# Altium footprint library kalios.PcbLib: 404 footprints (part 17 of 26)
Each footprint in its own frame and in the unit in brackets; x right, y up, seen from the top. Pads: shape width x height; smd on the part's side, far side on the other; paste and mask are expansions set on the pad; w line width, h text height; cw(c..) or ccw(c..) is an arc to the next point about the centre after c.
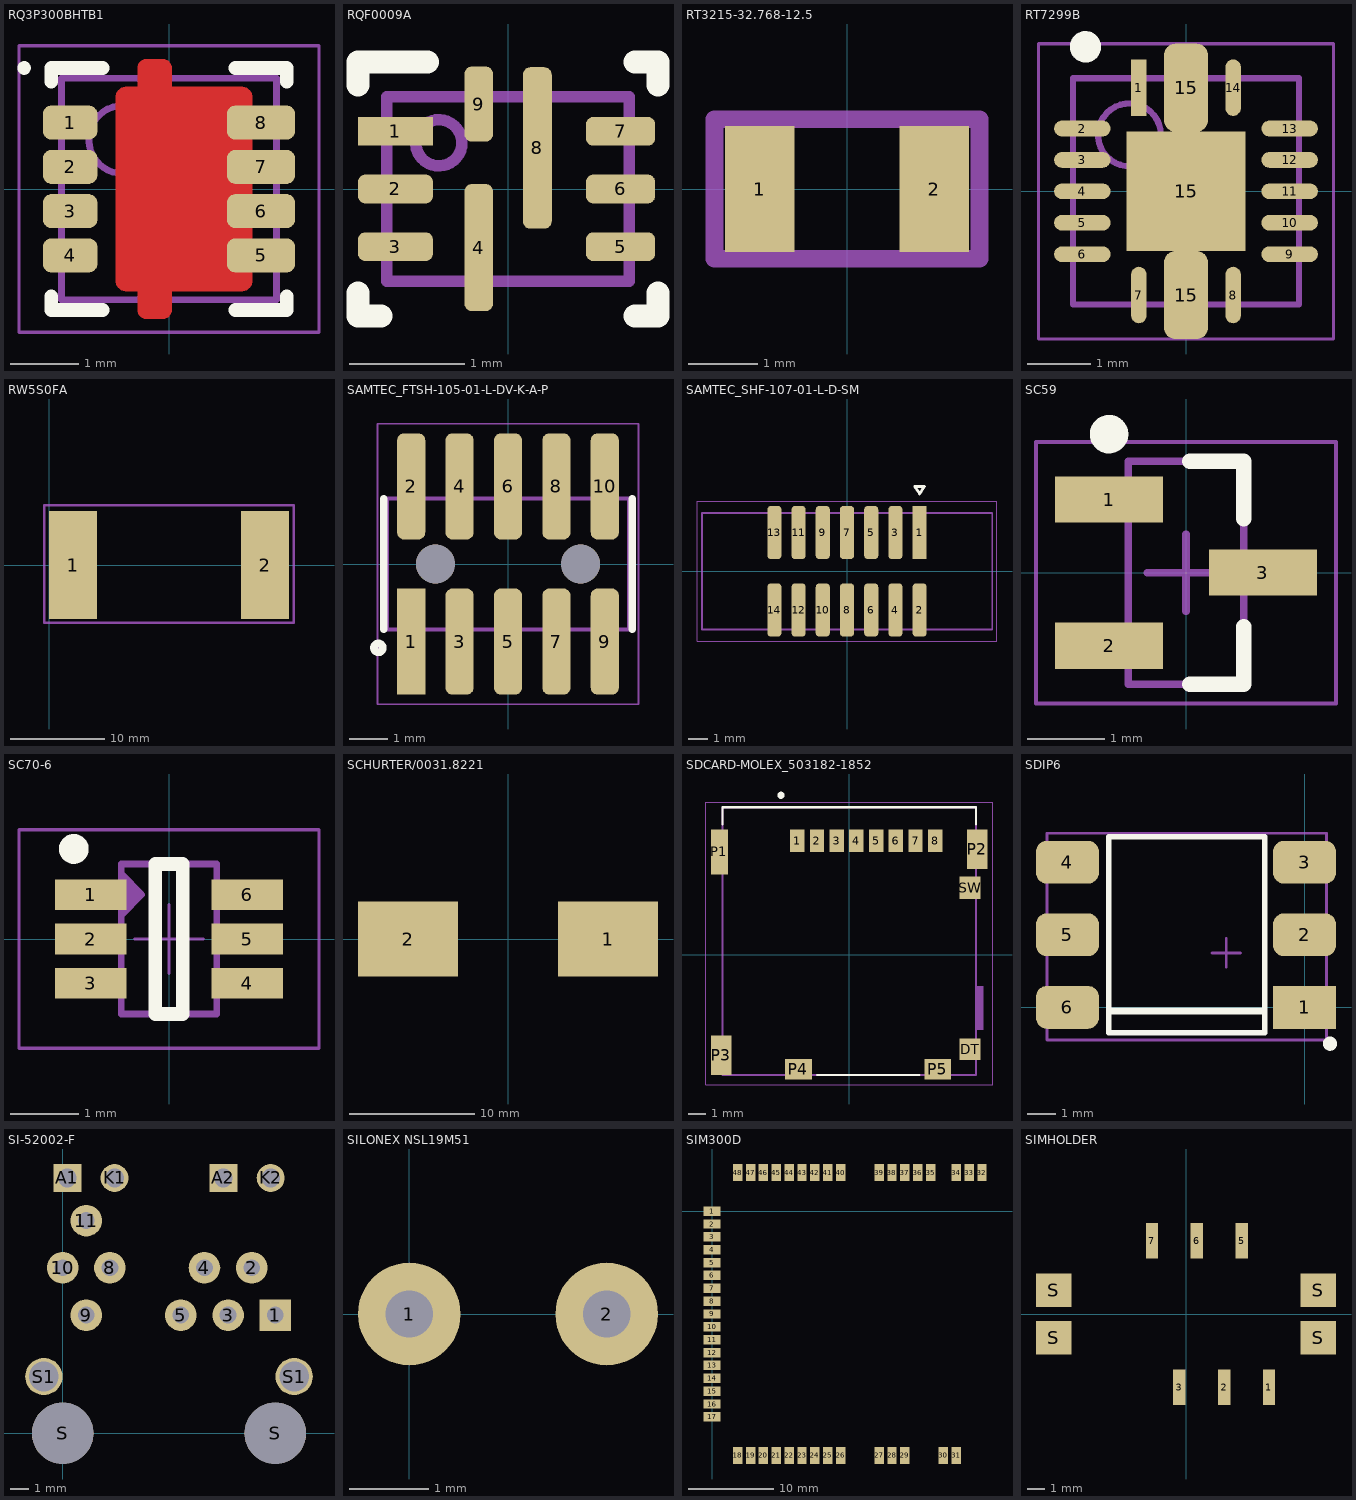
[diagram p16: the footprints below, top view; thin cyan lines are the x and y axes]

## RQ3P300BHTB1 [mm] "8-Leads, Body 3.15x3.05mm, Pitch 0.65mm, Thermal Pad 3.00x2.00mm, Manufacturer Guidelines"
height 0.85
pads (8):
  rrect50% 0.8x0.5 smd: 1(-1.45,0.975) 2(-1.45,0.325) 3(-1.45,-0.325) 4(-1.45,-0.975)
  rrect50% 1x0.5 smd: 5(1.35,-0.975) 6(1.35,-0.325) 7(1.35,0.325) 8(1.35,0.975)
Top Layer:
  region: -0.78,-1.35 -0.78,-1.365 -0.774,-1.394 -0.763,-1.421 -0.747,-1.446 -0.726,-1.467 -0.701,-1.483 -0.674,-1.494 -0.645,-1.5 -0.63,-1.5 -0.46,-1.5 -0.46,-1.775 -0.46,-1.8 -0.441,-1.846 -0.406,-1.881 -0.36,-1.9 -0.335,-1.9 -0.085,-1.9 -0.06,-1.9 -0.014,-1.881 0.021,-1.846 0.04,-1.8 0.04,-1.775 0.04,-1.5 1.07,-1.5 1.085,-1.5 1.114,-1.494 1.141,-1.483 1.166,-1.467 1.187,-1.446 1.203,-1.421 1.214,-1.394 1.22,-1.365 1.22,-1.35 1.22,1.35 1.22,1.365 1.214,1.394 1.203,1.421 1.187,1.446 1.166,1.467 1.141,1.483 1.114,1.494 1.085,1.5 1.07,1.5 0.04,1.5 0.04,1.775 0.04,1.8 0.021,1.846 -0.014,1.881 -0.06,1.9 -0.085,1.9 -0.335,1.9 -0.36,1.9 -0.406,1.881 -0.441,1.846 -0.46,1.8 -0.46,1.775 -0.46,1.5 -0.63,1.5 -0.645,1.5 -0.674,1.494 -0.701,1.483 -0.726,1.467 -0.747,1.446 -0.763,1.421 -0.774,1.394 -0.78,1.365 -0.78,1.35
Top Overlay:
  circle w0.1: c-2.125,1.775 r0.05
  lines w0.2: -1.725,-1.575 -1.725,-1.775 -0.97,-1.775 ; -1.725,1.575 -1.725,1.775 -0.97,1.775 ; 0.97,-1.775 1.725,-1.775 1.725,-1.575 ; 0.97,1.775 1.725,1.775 1.725,1.575
Top Assembly:
  circle w0.1: c-0.675,0.725 r0.5
  lines w0.1: -1.575,-1.625 1.575,-1.625 1.575,1.625 -1.575,1.625 -1.575,-1.625
Top Courtyard:
  lines w0.05: -2.2,-2.1 2.2,-2.1 2.2,2.1 -2.2,2.1 -2.2,-2.1
  lines w0.1: -0.5,0 0.5,0 ; 0,-0.5 0,0.5
3D body "RQ3P300BHTB1.STEP": height 0.9, standoff -0.05, extent -1.699,-1.709 1.701,1.711

## RQF0009A [mm]
pads (9):
  rect 0.65x0.25 smd paste+0 mask+0.051: 1(-0.976,0.5)
  rrect50% 0.65x0.25 smd paste+0 mask+0.051: 2(-0.976,0) 3(-0.976,-0.5)
  rrect50% 0.25x1.1 smd paste+0 mask+0.051: 4(-0.254,-0.508)
  rrect50% 0.6x0.25 smd paste+0 mask+0.051: 5(0.976,-0.5) 6(0.976,0) 7(0.976,0.5)
  rrect50% 0.25x1.4 smd paste+0 mask+0.051: 8(0.254,0.356)
  rrect50% 0.25x0.65 smd paste+0 mask+0.051: 9(-0.254,0.737)
Top Overlay:
  lines w0.2: -1.3,-0.9 -1.3,-1.1 -1.1,-1.1 ; -1.3,0.9 -1.3,1.1 -0.7,1.1 ; 1.1,-1.1 1.3,-1.1 1.3,-0.9 ; 1.1,1.1 1.3,1.1 1.3,0.9
Top 3D Body:
  circle w0.1: c-0.6,0.4 r0.2
  lines w0.1: -1.05,-0.8 1.05,-0.8 1.05,0.8 -1.05,0.8 -1.05,-0.8
Top Designator:
  text ".Designator" at -7.618,-0.508 h1.52
3D body "TPS56623x.STEP": height 1.04, standoff -0.01, extent -1.06,-0.813 1.06,0.807

## RT3215-32.768-12.5 [mm]
pads (2):
  rect 1x1.8 smd: 1(-1.25,0) 2(1.25,0)
Top Courtyard:
  lines w0.254: -1.9,-1 -1.9,1 1.9,1 1.9,-1 -1.9,-1
Top Designator:
  text ".Designator" at -3.499,-0.233 h0.7
3D body "RT3215-32.768-12.5-TR.STEP": height 0.9, standoff 0, extent -1.61,-0.76 1.61,0.76

## RT7299B [mm]
height 0.8
pads (17):
  rect 0.25x0.9 smd: 1(-0.75,1.65)
  oval 0.9x0.25 smd: 2(-1.65,1) 3(-1.65,0.5) 4(-1.65,0) 5(-1.65,-0.5) 6(-1.65,-1) 9(1.65,-1) 10(1.65,-0.5) 11(1.65,0) 12(1.65,0.5) 13(1.65,1)
  oval 0.25x0.9 smd: 7(-0.75,-1.65) 8(0.75,-1.65) 14(0.75,1.65)
  rrect50% 0.7x1.4 smd: 15(0,-1.65) 15(0,1.65)
  rect 1.9x1.9 smd: 15(0,0)
Top Overlay:
  circle w0.25: c-1.6,2.3 r0.125
Top 3D Body:
  circle w0.1: c-0.9,0.9 r0.5
  lines w0.1: -1.8,-1.8 1.8,-1.8 1.8,1.8 -1.8,1.8 -1.8,-1.8
Top Courtyard:
  lines w0.05: -2.35,-2.35 2.35,-2.35 2.35,2.35 -2.35,2.35 -2.35,-2.35
  lines w0.1: -0.5,0 0.5,0 ; 0,-0.5 0,0.5
Top Designator:
  text ".Designator" at -7.618,-0.42 h1.52
3D body "WQFN3.5x3.5.STEP": height 0.82, standoff 0.01, extent -1.75,-1.75 1.75,1.75

## RW5S0FA [mm]
pads (2):
  rect 5.08x11.43 smd: 1(2.54,0) 2(22.86,0)
Top Courtyard:
  lines w0.254: -0.508,-6.096 25.908,-6.096 25.908,6.35 -0.508,6.35 -0.508,-6.096
3D body "RW5S0FA10K0JE--3DModel-STEP-56544.STEP": height 10.31, standoff 0, extent 2.464,-4.572 22.936,4.699

## SAMTEC_FTSH-105-01-L-DV-K-A-P [mm]
pads (12):
  rect 0.74x2.79 smd: 1(-2.54,-2.035)
  rrect50% 0.74x2.79 smd: 2(-2.54,2.035) 3(-1.27,-2.035) 4(-1.27,2.035) 5(0,-2.035) 6(0,2.035) 7(1.27,-2.035) 8(1.27,2.035) 9(2.54,-2.035) 10(2.54,2.035)
  round 1.02 hole 1.02 unplated mask+0.102: ""(-1.905,0) ""(1.905,0)
Top Overlay:
  circle w0.2: c-3.4,-2.2 r0.115
  lines w0.2: -3.26,-1.715 -3.26,1.715 ; 3.26,-1.715 3.26,1.715
Top 3D Body:
  circle w0.2: c-3.4,-2.2 r0.1
  lines w0.1: -3.175,-1.715 -3.175,1.715 3.175,1.715 3.175,-1.715 -3.175,-1.715
Top Courtyard:
  lines w0.05: -3.425,-3.68 -3.425,3.68 3.425,3.68 3.425,-3.68 -3.425,-3.68
Top Designator:
  text ".Designator" at -3.769,-0.233 h0.7
3D body "FTSH-105-01-L-DV-K-A-P-TR.STEP": height 6.15, standoff -0.83, extent -3.175,-2.921 3.175,2.921

## SAMTEC_SHF-107-01-L-D-SM [mm]
pads (14):
  rect 0.74x2.795 smd: 1(3.81,2.032)
  rrect50% 0.74x2.795 smd: 2(3.81,-2.032) 3(2.54,2.032) 4(2.54,-2.032) 5(1.27,2.032) 6(1.27,-2.032) 7(0,2.033) 8(0,-2.033) 9(-1.27,2.032) 10(-1.27,-2.032) 11(-2.54,2.032) 12(-2.54,-2.032) 13(-3.81,2.032) 14(-3.81,-2.032)
Top Overlay:
  lines w0.152: 3.556,4.445 3.81,4.064 4.064,4.445 3.556,4.445
Top 3D Body:
  lines w0.1: -7.62,-3.048 7.62,-3.048 7.62,3.05 ; -7.604,-3.048 -7.604,3.035 ; 7.62,-2.54 7.62,3.05 ; 7.62,3.05 -7.62,3.05 7.62,3.05
Top Courtyard:
  lines w0.05: -7.87,-3.68 7.87,-3.68 7.87,3.68 -7.87,3.68 -7.87,-3.68
3D body "SHF-107-01-L-D-SM.stp": height 5.33, standoff -0.13, extent -7.62,-3.048 7.62,3.048

## SC59 [mm] "SOT23, 3-Leads, Body 2.90x2.50mm, Pitch 0.95mm, IPC Medium Density"
height 1.1
pads (3):
  rect 1.4x0.6 smd: 1(-1,0.95) 2(-1,-0.95) 3(1,0)
Top Overlay:
  circle w0.25: c-1,1.8 r0.125
  lines w0.2: 0.05,-1.45 0.75,-1.45 0.75,-0.7 ; 0.05,1.45 0.75,1.45 0.75,0.7
Top 3D Body:
  lines w0.1: -0.75,-1.45 0.75,-1.45 0.75,1.45 -0.75,1.45 -0.75,-1.45
Top Courtyard:
  lines w0.05: -1.95,-1.7 1.95,-1.7 1.95,1.7 -1.95,1.7 -1.95,-1.7
  lines w0.1: -0.5,0 0.5,0 ; 0,-0.5 0,0.5
Top Designator:
  text ".Designator" at -7.618,-0.345 h1.52
3D body: height 1.1, standoff 0.05, extent -0.75,-1.45 0.75,1.45

## SC70-6 [mm] "SOT363, 6-Leads, Body 2x1.3mm, Pitch 0.65mm, Lead Span 2.1mm, IPC Low Density"
height 1.1
pads (6):
  rect 1.05x0.45 smd: 1(-1.15,0.65) 2(-1.15,0) 3(-1.15,-0.65) 4(1.15,-0.65) 5(1.15,0) 6(1.15,0.65)
Top Overlay:
  circle w0.254: c-1.397,1.321 r0.092
  lines w0.2: -0.2,-1.1 -0.2,1.1 0.2,1.1 0.2,-1.1 -0.2,-1.1
Top 3D Body:
  lines w0.1: -0.7,0.35 -0.4,0.65 -0.7,0.95 ; -0.7,0.45 -0.5,0.65 -0.7,0.85 ; -0.7,0.55 -0.6,0.65 -0.7,0.75 ; -0.7,-1.1 0.7,-1.1 0.7,1.1 -0.7,1.1 -0.7,-1.1
Top Courtyard:
  lines w0.05: -0.5,0 0,0 ; 0,-0.5 0,0 ; 0,0.5 0,0 ; 0.5,0 0,0 ; -2.2,-1.6 -2.2,1.6 2.2,1.6 2.2,-1.6 -2.2,-1.6
Top Designator:
  text ".Designator" at -7.618,-0.508 h1.52
3D body "SC-70-6.STEP": height 1.1, standoff -0.01, extent -1.15,-1.132 1.1,1.118

## SCHURTER/0031.8221 [mm]
pads (2):
  rect 8x6 smd: 1(8,0) 2(-8,0)
Top Designator:
  text ".Designator" at -7.618,-0.711 h1.52
3D body "0031.8221 with fuse.STEP": height 12.22, standoff 0.22, extent -11.352,-5.003 11.348,4.597

## SDCARD-MOLEX_503182-1852 [mm]
pads (15):
  rect 0.8x1.24 smd: 1(-2.9,6.355) 2(-1.8,6.355) 3(-0.7,6.355) 4(0.4,6.355) 5(1.5,6.355) 6(2.6,6.355) 7(3.7,6.355) 8(4.8,6.355)
  rect 1.16x1.2 smd: DT(6.74,-5.275)
  rect 0.95x2.5 smd: P1(-7.245,5.725)
  rect 1.15x2.2 smd: P2(7.145,5.875) P3(-7.145,-5.605)
  rect 1.5x1.15 smd: P4(-2.84,-6.4) P5(4.94,-6.4)
  rect 1.16x1.25 smd: SW(6.74,3.725)
Top Overlay:
  circle w0.2: c-3.81,8.89 r0.1
  lines w0.127: -7.07,7.28 -7.07,8.225 7.07,8.225 7.07,7.28 ; -1.8,-6.725 3.9,-6.725
Top 3D Body:
  lines w0.127: -7.07,-6.725 7.07,-6.725 7.07,8.225 -7.07,8.225 -7.07,-6.725
Top Courtyard:
  region: 7.47,-4.184 7.085,-4.184 7.085,-1.775 7.47,-1.775
  lines w0.05: -8,-7.25 8,-7.25 8,8.5 -8,8.5 -8,-7.25
Top Designator:
  text ".Designator" at -7.618,0.4 h1.52
3D body "5031821852.STEP": height 1.36, standoff -0.14, extent -7.447,-6.713 7.493,8.237

## SDIP6 [mm] "8-Pin Small Outline Integrated Circuit 1.27 mm Pitch, IPC Low Density"
height 1.75
pads (6):
  rect 2.2x1.5 smd: 1(0,0)
  rrect50% 2.2x1.5 smd: 2(0,2.54) 3(0,5.08) 4(-8.3,5.08) 5(-8.3,2.54) 6(-8.3,0)
Top Overlay:
  circle w0.25: c0.889,-1.27 r0.125
  lines w0.2: -6.858,-0.889 -1.397,-0.889 -1.397,5.969 -6.858,5.969 -6.858,-0.889
  lines w0.254: -6.731,-0.127 -1.53,-0.127
Top Courtyard:
  lines w0.1: -3.243,1.905 -2.243,1.905 ; -2.743,1.405 -2.743,2.405 ; -9.017,-1.143 0.762,-1.143 0.762,6.096 -9.017,6.096 -9.017,-1.143
Top Designator:
  text ".Designator" at -11.768,1.815 h1.52
3D body "User Library-DIP-6-SMD.step": height 3.71, standoff 0, extent -9.038,-1.085 0.762,6.165

## SI-52002-F [mm]
pads (17):
  rect 1.7x1.7 hole 0.9: 1(11.43,6.35)
  round 1.7 hole 0.9: 2(10.16,8.89) 3(8.89,6.35) 4(7.62,8.89) 5(6.35,6.35) 8(2.54,8.89) 9(1.27,6.35) 10(0,8.89) 11(1.27,11.43)
  rect 1.5x1.5 hole 1: A1(0.25,13.72) A2(8.64,13.72)
  round 1.5 hole 1: K1(2.79,13.72) K2(11.18,13.72)
  round 3.3 hole 3.3 unplated: S(0,0) S(11.43,0)
  round 2 hole 1.6: S1(-1.01,3.05) S1(12.44,3.05)
Top Designator:
  text ".Designator" at -1.928,1.372 h1.52
3D body "SI-52003-F.STEP": height 13.97, standoff -3.08, extent -2.375,-10.82 13.755,14.58

## SILONEX NSL19M51 [mm]
pads (2):
  round 1.3 hole 0.6 unplated: 1(0,0) 2(2.5,0)
Top Designator:
  text ".Designator" at -6.407,-0.508 h1.52
3D body "Pièce3.STEP": height 1.7, standoff -5, extent -0.83,-1.7 3.23,1.7

## SIM300D [mm]
pads (48):
  rect 2x1.1 smd: 1(0,0) 2(0,-1.5) 3(0,-3) 4(0,-4.5) 5(0,-6) 6(0,-7.5) 7(0,-9) 8(0,-10.5) 9(0,-12) 10(0,-13.5) 11(0,-15) 12(0,-16.5) 13(0,-18) 14(0,-19.5) 15(0,-21) 16(0,-22.5) 17(0,-24)
  rect 1.1x2 smd: 18(3,-28.5) 19(4.5,-28.5) 20(6,-28.5) 21(7.5,-28.5) 22(9,-28.5) 23(10.5,-28.5) 24(12,-28.5) 25(13.5,-28.5) 26(15,-28.5) 27(19.5,-28.5) 28(21,-28.5) 29(22.5,-28.5) 30(27,-28.5) 31(28.5,-28.5) 32(31.5,4.5) 33(30,4.5) 34(28.5,4.5) 35(25.5,4.5) 36(24,4.5) 37(22.5,4.5) 38(21,4.5) 39(19.5,4.5) 40(15,4.5) 41(13.5,4.5) 42(12,4.5) 43(10.5,4.5) 44(9,4.5) 45(7.5,4.5) 46(6,4.5) 47(4.5,4.5) 48(3,4.5)
Top Designator:
  text ".Designator" at 8.332,-12.508 h1.52
3D body "SIM300D.STEP": height 2.97, standoff -0.03, extent -0.03,-28.505 33,4.505

## SIMHOLDER [mm]
pads (10):
  rect 0.7x2 smd: 1(4.7,-4.15) 2(2.16,-4.15) 3(-0.38,-4.15) 5(3.15,4.15) 6(0.61,4.15) 7(-1.93,4.15)
  rect 2x1.9 smd: S(-7.5,-1.35) S(-7.5,1.35) S(7.5,-1.35) S(7.5,1.35)
Top Designator:
  text ".Designator" at -7.618,2.839 h1.52
3D body "SimAll.STEP": height 1.82, standoff -0.26, extent -8.11,-9.501 8.19,16.195